# Altium integrated library minor project.IntLib: 30 symbols
Pins are listed as number, name and electrical type; pins without a type are passive.

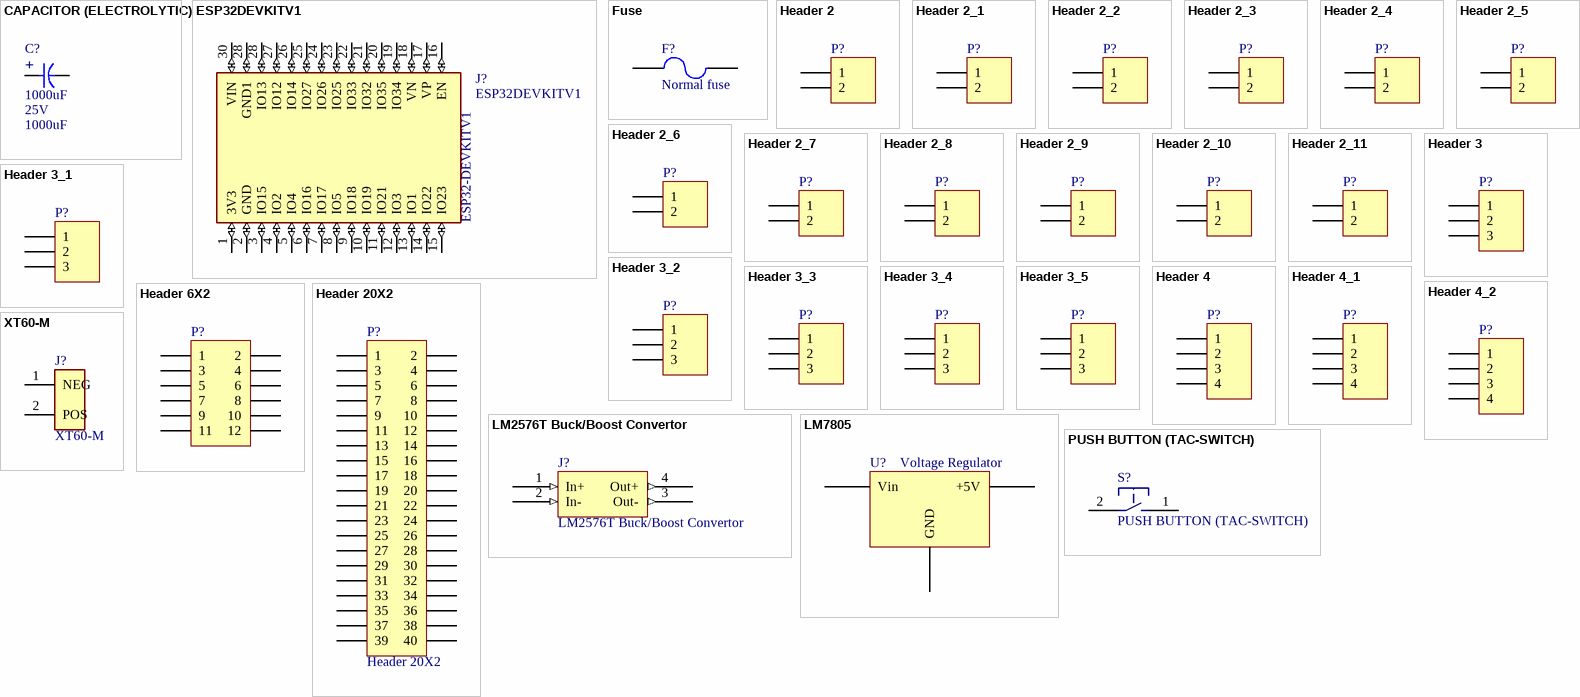
[diagram p0: symbols CAPACITOR (ELECTROLYTIC) to XT60-M]

## CAPACITOR (ELECTROLYTIC)
designator C?, comment 1000uF  volt: 25V
value: 1000uF
footprint SELF_CAP_THT5MM
footprint SELF_CAP_THT6MM
footprint SELF_CAP_SMCA
pins: +, -

## ESP32DEVKITV1
designator J?
Dual core, Wi-Fi: 2.4 GHz up to 150 Mbits/s,BLE (Bluetooth Low Energy) and legacy Bluetooth, 32 bits, Up to 240 MHz; MF: Do it; Availability: No availability data; MP: ESP32 DEVKIT V1; SnapEDA_Link: https://www.snapeda.com/parts/ESP32%20DEVKIT%20V1/Do%20it/view-part/5659245/?ref=snap; Value: *; Price: None; Check_prices: https://www.snapeda.com/parts/ESP32%20DEVKIT%20V1/Do%20it/view-part/5659245/?ref=eda; Package: Package
footprint ESP32-DEVKITV1
pins: 1 3V3 (io), 2 GND (io), 3 IO15 (io), 4 IO2 (io), 5 IO4 (io), 6 IO16 (io), 7 IO17 (io), 8 IO5 (io), 9 IO18 (io), 10 IO19 (io), 11 IO21 (io), 12 IO3 (io), 13 IO1 (io), 14 IO22 (io), 15 IO23 (io), 16 EN (io), 17 VP (io), 18 VN (io), 19 IO34 (io), 20 IO35 (io), 21 IO32 (io), 22 IO33 (io), 23 IO25 (io), 24 IO26 (io), 25 IO27 (io), 26 IO14 (io), 27 IO12 (io), 28 IO13 (io), 28 GND1 (io), 30 VIN (io)
text: ESP32-DEVKITV1

## Fuse
designator F?, comment Normal fuse
ASiD Part Number: Fuse-AS
footprint MY_FUSE
pins: 1, 2

## Header 2
designator P?  (value not drawn)
motor driver power; ASiD Part Number: Header 2-AS
footprint My_1X02
signal-integrity model Connector
footprint My_ Power_Connector
footprint My_CN2
footprint MY_MSTBA2
footprint MY_power_cord
footprint MY_6410-02
footprint MY_7395-02
footprint MY_FE02
footprint MY_FE02W
footprint MY_MA02-1W
footprint MY_ECH381H_02P
pins: 1, 2

## Header 2_1
designator P?, comment Header 2  (value not drawn)
power in; ASiD Part Number: Header 2-AS
footprint My_1X02
signal-integrity model Connector
footprint My_ Power_Connector
footprint My_CN2
footprint MY_MSTBA2
footprint MY_power_cord
footprint MY_6410-02
footprint MY_7395-02
footprint MY_FE02
footprint MY_FE02W
footprint MY_MA02-1W
footprint MY_ECH381H_02P
pins: 1, 2

## Header 2_2
designator P?, comment Header 2  (value not drawn)
led supply; ASiD Part Number: Header 2-AS
footprint My_1X02
signal-integrity model Connector
footprint My_ Power_Connector
footprint My_CN2
footprint MY_MSTBA2
footprint MY_power_cord
footprint MY_6410-02
footprint MY_7395-02
footprint MY_FE02
footprint MY_FE02W
footprint MY_MA02-1W
footprint MY_ECH381H_02P
pins: 1, 2

## Header 2_3
designator P?, comment Header 2  (value not drawn)
manual control switch3; ASiD Part Number: Header 2-AS
footprint My_1X02
signal-integrity model Connector
footprint My_ Power_Connector
footprint My_CN2
footprint MY_MSTBA2
footprint MY_power_cord
footprint MY_6410-02
footprint MY_7395-02
footprint MY_FE02
footprint MY_FE02W
footprint MY_MA02-1W
footprint MY_ECH381H_02P
pins: 1, 2

## Header 2_4
designator P?, comment Header 2  (value not drawn)
manual control switch2; ASiD Part Number: Header 2-AS
footprint My_1X02
signal-integrity model Connector
footprint My_ Power_Connector
footprint My_CN2
footprint MY_MSTBA2
footprint MY_power_cord
footprint MY_6410-02
footprint MY_7395-02
footprint MY_FE02
footprint MY_FE02W
footprint MY_MA02-1W
footprint MY_ECH381H_02P
pins: 1, 2

## Header 2_5
designator P?, comment Header 2  (value not drawn)
manual control switch1; ASiD Part Number: Header 2-AS
footprint My_1X02
signal-integrity model Connector
footprint My_ Power_Connector
footprint My_CN2
footprint MY_MSTBA2
footprint MY_power_cord
footprint MY_6410-02
footprint MY_7395-02
footprint MY_FE02
footprint MY_FE02W
footprint MY_MA02-1W
footprint MY_ECH381H_02P
pins: 1, 2

## Header 2_6
designator P?, comment Header 2  (value not drawn)
i2c port for future use.Raspberry pi 2b.; ASiD Part Number: Header 2-AS
footprint My_1X02
signal-integrity model Connector
footprint My_ Power_Connector
footprint My_CN2
footprint MY_MSTBA2
footprint MY_power_cord
footprint MY_6410-02
footprint MY_7395-02
footprint MY_FE02
footprint MY_FE02W
footprint MY_MA02-1W
footprint MY_ECH381H_02P
pins: 1, 2

## Header 2_7
designator P?, comment Header 2  (value not drawn)
selection of pi 3.3v power out; ASiD Part Number: Header 2-AS
footprint My_1X02
signal-integrity model Connector
footprint My_ Power_Connector
footprint My_CN2
footprint MY_MSTBA2
footprint MY_power_cord
footprint MY_6410-02
footprint MY_7395-02
footprint MY_FE02
footprint MY_FE02W
footprint MY_MA02-1W
footprint MY_ECH381H_02P
pins: 1, 2

## Header 2_8
designator P?, comment Header 2  (value not drawn)
EXTERNAL RESET; ASiD Part Number: Header 2-AS
footprint My_1X02
signal-integrity model Connector
footprint My_ Power_Connector
footprint My_CN2
footprint MY_MSTBA2
footprint MY_power_cord
footprint MY_6410-02
footprint MY_7395-02
footprint MY_FE02
footprint MY_FE02W
footprint MY_MA02-1W
footprint MY_ECH381H_02P
pins: 1, 2

## Header 2_9
designator P?, comment Header 2  (value not drawn)
motor encoder; ASiD Part Number: Header 2-AS
footprint My_1X02
signal-integrity model Connector
footprint My_ Power_Connector
footprint My_CN2
footprint MY_MSTBA2
footprint MY_power_cord
footprint MY_6410-02
footprint MY_7395-02
footprint MY_FE02
footprint MY_FE02W
footprint MY_MA02-1W
footprint MY_ECH381H_02P
pins: 1, 2

## Header 2_10
designator P?, comment Header 2  (value not drawn)
I2C of esp32 port 1; ASiD Part Number: Header 2-AS
footprint My_1X02
signal-integrity model Connector
footprint My_ Power_Connector
footprint My_CN2
footprint MY_MSTBA2
footprint MY_power_cord
footprint MY_6410-02
footprint MY_7395-02
footprint MY_FE02
footprint MY_FE02W
footprint MY_MA02-1W
footprint MY_ECH381H_02P
pins: 1, 2

## Header 2_11
designator P?, comment Header 2  (value not drawn)
I2C of esp32 port 2; ASiD Part Number: Header 2-AS
footprint My_1X02
signal-integrity model Connector
footprint My_ Power_Connector
footprint My_CN2
footprint MY_MSTBA2
footprint MY_power_cord
footprint MY_6410-02
footprint MY_7395-02
footprint MY_FE02
footprint MY_FE02W
footprint MY_MA02-1W
footprint MY_ECH381H_02P
pins: 1, 2

## Header 3
designator P?  (value not drawn)
PROXIMITY SENSOR 3; ASiD Part Number: Header 3-AS
footprint My_1X03
signal-integrity model Connector
footprint My_CN3
footprint MY_MSTBA3
footprint MY_6410-03
footprint MY_7395-03
footprint MY_FE03
footprint MY_FE03W
footprint MY_MA03-1W
footprint MY_ECH381H_03P
pins: 1, 2, 3

## Header 3_1
designator P?, comment Header 3  (value not drawn)
PROXIMITY SENSOR 2; ASiD Part Number: Header 3-AS
footprint My_1X03
signal-integrity model Connector
footprint My_CN3
footprint MY_MSTBA3
footprint MY_6410-03
footprint MY_7395-03
footprint MY_FE03
footprint MY_FE03W
footprint MY_MA03-1W
footprint MY_ECH381H_03P
pins: 1, 2, 3

## Header 3_2
designator P?, comment Header 3  (value not drawn)
PROXIMITY SENSOR 1; ASiD Part Number: Header 3-AS
footprint My_1X03
signal-integrity model Connector
footprint My_CN3
footprint MY_MSTBA3
footprint MY_6410-03
footprint MY_7395-03
footprint MY_FE03
footprint MY_FE03W
footprint MY_MA03-1W
footprint MY_ECH381H_03P
pins: 1, 2, 3

## Header 3_3
designator P?, comment Header 3  (value not drawn)
SORTING MECHANISM -servo motor 1; ASiD Part Number: Header 3-AS
footprint My_1X03
signal-integrity model Connector
footprint My_CN3
footprint MY_MSTBA3
footprint MY_6410-03
footprint MY_7395-03
footprint MY_FE03
footprint MY_FE03W
footprint MY_MA03-1W
footprint MY_ECH381H_03P
pins: 1, 2, 3

## Header 3_4
designator P?, comment Header 3  (value not drawn)
SORTING MECHANISM -servo motor 2; ASiD Part Number: Header 3-AS
footprint My_1X03
signal-integrity model Connector
footprint My_CN3
footprint MY_MSTBA3
footprint MY_6410-03
footprint MY_7395-03
footprint MY_FE03
footprint MY_FE03W
footprint MY_MA03-1W
footprint MY_ECH381H_03P
pins: 1, 2, 3

## Header 3_5
designator P?, comment Header 3  (value not drawn)
manual control - speed; ASiD Part Number: Header 3-AS
footprint My_1X03
signal-integrity model Connector
footprint My_CN3
footprint MY_MSTBA3
footprint MY_6410-03
footprint MY_7395-03
footprint MY_FE03
footprint MY_FE03W
footprint MY_MA03-1W
footprint MY_ECH381H_03P
pins: 1, 2, 3

## Header 4
designator P?  (value not drawn)
motor driver control pin; ASiD Part Number: Header 4-AS
footprint My_1X04
signal-integrity model Connector
footprint MY_MSTBA4
footprint MY_FPC4_1mm
footprint MY_6410-04
footprint MY_7395-04
footprint MY_FE04
footprint MY_FE04W
footprint MY_MA04-1W
pins: 1, 2, 3, 4

## Header 4_1
designator P?, comment Header 4  (value not drawn)
SORTING MECHANISM for uln2003; ASiD Part Number: Header 4-AS
footprint My_1X04
signal-integrity model Connector
footprint MY_MSTBA4
footprint MY_FPC4_1mm
footprint MY_6410-04
footprint MY_7395-04
footprint MY_FE04
footprint MY_FE04W
footprint MY_MA04-1W
pins: 1, 2, 3, 4

## Header 4_2
designator P?, comment Header 4  (value not drawn)
SPI for future use. raspberry pi 2b; ASiD Part Number: Header 4-AS
footprint My_1X04
signal-integrity model Connector
footprint MY_MSTBA4
footprint MY_FPC4_1mm
footprint MY_6410-04
footprint MY_7395-04
footprint MY_FE04
footprint MY_FE04W
footprint MY_MA04-1W
pins: 1, 2, 3, 4

## Header 6X2
designator P?  (value not drawn)
Header, 12-Pin, Dual row; ASiD Part Number: Header 6X2-AS
footprint My_2X06
signal-integrity model Connector
footprint MY_FE06-2
footprint MY_FE06-2W
footprint MY_MA06-2W
pins: 1, 2, 3, 4, 5, 6, 7, 8, 9, 10, 11, 12

## Header 20X2
designator P?
rasbery pi 2 b connector; ASiD Part Number: Header 20X2-AS
signal-integrity model Connector
footprint My_IDCM40A
footprint My_IDCRM40
footprint MY_2X20
footprint My_2X20_BOX
footprint MY_ML40L
footprint MY_FE20-2
footprint MY_FE20-2W
footprint MY_MA20-2W
pins: 1, 2, 3, 4, 5, 6, 7, 8, 9, 10, 11, 12, 13, 14, 15, 16, 17, 18, 19, 20, 21, 22, 23, 24, 25, 26, 27, 28, 29, 30, 31, 32, 33, 34, 35, 36, 37, 38, 39, 40

## LM2576T Buck/Boost Convertor
designator J?
footprint LM2596 MODULE
pins: 1 In+ (in), 2 In- (in), 3 Out- (out), 4 Out+ (out)

## LM7805
designator U?, comment Voltage Regulator
+5v voltage regulator
footprint SELF_LM7805_THT
pins: 1 Vin (power), 2 GND (power), 3 +5V (power)

## PUSH BUTTON (TAC-SWITCH)
designator S?
footprint SELF_TACTILE_THT
pins: 1, 2

## XT60-M
designator J?
Plug; DC supply; XT60; male; PIN: 2; for cable; soldered; 30A; 500V; MF: AMASS; MP: XT60-M; Price: None; Package: Package Analog Devices; Value: *; Availability: Unavailable; SnapEDA_Link: https://www.snapeda.com/parts/XT60-M/AMASS/view-part/2883912/?ref=snap
footprint AMASS_XT60-M
pins: 1 NEG, 2 POS